# Altium footprint library RPIadaptor.PcbLib: 85 footprints (part 5 of 6)
Each footprint in its own frame and in the unit in brackets; x right, y up, seen from the top. Pads: shape width x height; smd on the part's side, far side on the other; paste and mask are expansions set on the pad; w line width, h text height; cw(c..) or ccw(c..) is an arc to the next point about the centre after c.
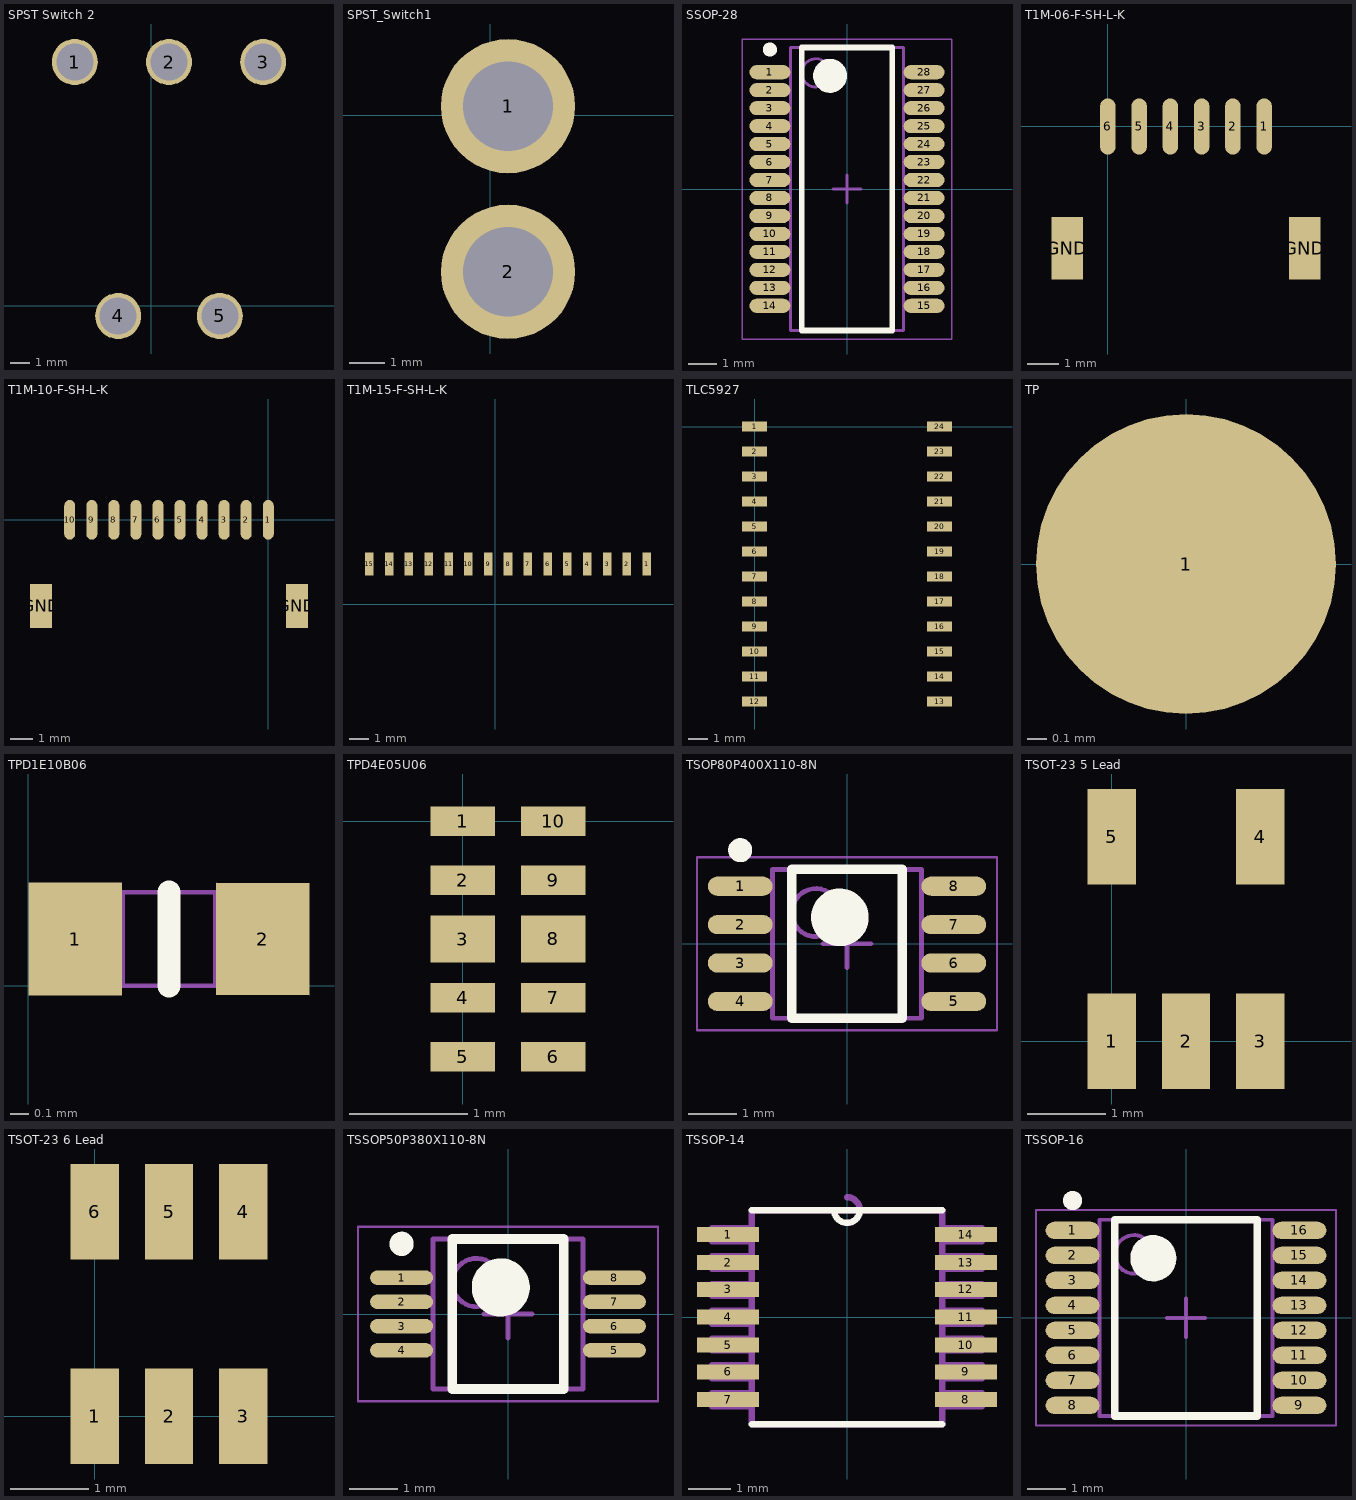
[diagram p4: the footprints below, top view; thin cyan lines are the x and y axes]

## SPST Switch 2 [mm]
pads (5):
  round 2.3 hole 1.85: 1(-3.81,12.192) 2(0.9,12.192) 3(5.61,12.192) 4(-1.64,-0.508) 5(3.44,-0.508)
3D body "M2012S2A2W30.stp": height 3.8, standoff -8.44, extent -5.613,-13.39 7.391,12.954

## SPST_Switch1 [mil]
pads (2):
  round 150 hole 100: 1(20,10) 2(20,-175)
3D body "M2011SS1W01.stp": height 1162.95, standoff -158, extent -217,-427 254.98,85

## SSOP-28 [mm]
height 1.73
pads (28):
  oval 1.45x0.5 smd: 1(-2.725,4.127) 2(-2.725,3.492) 3(-2.725,2.857) 4(-2.725,2.222) 5(-2.725,1.587) 6(-2.725,0.953) 7(-2.725,0.318) 8(-2.725,-0.318) 9(-2.725,-0.953) 10(-2.725,-1.587) 11(-2.725,-2.222) 12(-2.725,-2.857) 13(-2.725,-3.492) 14(-2.725,-4.127) 15(2.725,-4.127) 16(2.725,-3.492) 17(2.725,-2.857) 18(2.725,-2.222) 19(2.725,-1.587) 20(2.725,-0.953) 21(2.725,-0.318) 22(2.725,0.318) 23(2.725,0.953) 24(2.725,1.587) 25(2.725,2.222) 26(2.725,2.857) 27(2.725,3.492) 28(2.725,4.127)
Top Overlay:
  circle w0.25: c-2.725,4.928 r0.125
  circle w0.6: c-0.6,4 r0.3
  lines w0.2: -1.6,-5 -1.6,5 1.6,5 1.6,-5 -1.6,-5
Mechanical 13:
  circle w0.1: c-1.1,4.1 r0.5
  lines w0.1: -2,-5 -2,5 2,5 2,-5 -2,-5
Mechanical 15:
  lines w0.05: -3.7,-5.3 -3.7,5.3 3.7,5.3 3.7,-5.3 -3.7,-5.3
  lines w0.1: -0.5,0 0.5,0 ; 0,-0.5 0,0.5
3D body "SSOP-28b.step": height 1.73, standoff 0, extent -2.997,-5 2.997,5

## T1M-06-F-SH-L-K [mm]
pads (8):
  oval 0.5x1.8 smd: 1(5,0) 2(4,0) 3(3,0) 4(2,0) 5(1,0) 6(0,0)
  rect 1x2 smd: GND(-1.3,-3.9) GND(6.3,-3.9)
3D body "T1M-06-F-SH-L-K.stp": height 4.72, standoff 0, extent -1.7,-5.475 6.7,0.425

## T1M-10-F-SH-L-K [mm]
pads (12):
  oval 0.5x1.8 smd: 1(0,0) 2(-1,0) 3(-2,0) 4(-3,0) 5(-4,0) 6(-5,0) 7(-6,0) 8(-7,0) 9(-8,0) 10(-9,0)
  rect 1x2 smd: GND(-10.3,-3.9) GND(1.3,-3.9)
3D body "T1M-10-F-SH-L-K.stp": height 4.7, standoff -0.02, extent -10.7,-5.475 1.7,0.425

## T1M-15-F-SH-L-K [mil]
pads (15):
  rect 17x45 smd: 1(301.18,80) 2(261.81,80) 3(222.44,80) 4(183.07,80) 5(143.7,80) 6(104.33,80) 7(64.96,80) 8(25.59,80) 9(-13.78,80) 10(-53.15,80) 11(-92.52,80) 12(-131.89,80) 13(-171.26,80) 14(-210.63,80) 15(-250,80)
3D body "T1M-15-F-SH-L.stp": height 181.6, standoff 0.5, extent -317,-137.28 368.04,95

## TLC5927 [mil]
pads (24):
  rect 50x20 smd: 1(0,0) 2(0,-50) 3(0,-100) 4(0,-150) 5(0,-200) 6(0,-250) 7(0,-300) 8(0,-350) 9(0,-400) 10(0,-450) 11(0,-500) 12(0,-550) 13(370,-550) 14(370,-500) 15(370,-450) 16(370,-400) 17(370,-350) 18(370,-300) 19(370,-250) 20(370,-200) 21(370,-150) 22(370,-100) 23(370,-50) 24(370,0)
3D body "User Library-24 pin soic.STEP": height 111.26, standoff 0.63, extent -11.85,-584.18 381.85,30

## TP [mil]
pads (1):
  round 60 all layers, no hole: 1(0,0)

## TPD1E10B06 [mil]
pads (2):
  rect 20x24 smd: 1(10,10) 2(50,10)
Top Overlay:
  lines w5: 30,0 30,20
Mechanical 1:
  lines w1: 10,0 10,20 16.07,20 49.69,20 49.69,0 10.32,0 ; 20.16,0 20.16,20 ; 39.85,0 39.85,20
3D body: height 18, standoff 0, extent 20,0 40,20
3D body: height 18, standoff 0, extent 40,0 49.69,20
3D body: height 18, standoff 0, extent 10,0 20,20

## TPD4E05U06 [mm]
pads (10):
  rect 0.55x0.25 smd: 1(0,0) 2(0,-0.5) 4(0,-1.5) 5(0,-2) 6(0.77,-2) 7(0.77,-1.5) 9(0.77,-0.5) 10(0.77,0)
  rect 0.55x0.4 smd: 3(0,-1) 8(0.77,-1)
3D body "User Library-UDFN10.STEP": height 0.71, standoff 0.16, extent -0.178,-2.241 0.832,0.259

## TSOP80P400X110-8N [mm] "TSOP, 8-Leads, Body 2.50x2.65mm, Pitch 0.80mm, IPC Medium Density"
height 1.1
pads (8):
  oval 1.35x0.4 smd: 1(-2.225,1.2) 2(-2.225,0.4) 3(-2.225,-0.4) 4(-2.225,-1.2) 5(2.225,-1.2) 6(2.225,-0.4) 7(2.225,0.4) 8(2.225,1.2)
Top Overlay:
  circle w0.6: c-0.15,0.55 r0.3
  circle w0.25: c-2.225,1.95 r0.125
  lines w0.2: -1.15,-1.55 1.15,-1.55 1.15,1.55 -1.15,1.55 -1.15,-1.55
Mechanical 13:
  circle w0.1: c-0.65,0.65 r0.5
  lines w0.1: -1.55,-1.55 1.55,-1.55 1.55,1.55 -1.55,1.55 -1.55,-1.55
Mechanical 15:
  lines w0.05: -3.125,-1.8 3.125,-1.8 3.125,1.8 -3.125,1.8 -3.125,-1.8
  lines w0.1: -0.5,0 0.5,0 ; 0,-0.5 0,0.5
3D body "DGK8.stp": height 1.09, standoff 0, extent -2.427,-1.549 2.627,1.549

## TSOT-23 5 Lead [mm]
pads (5):
  rect 0.62x1.22 smd: 1(0,0) 2(0.95,0) 3(1.9,0) 4(1.9,2.62) 5(0,2.62)
3D body "User Library-TSOT23-5.STEP": height 0.95, standoff 0, extent -0.523,-0.284 2.377,2.912

## TSOT-23 6 Lead [mm]
pads (6):
  rect 0.62x1.22 smd: 1(0,0) 2(0.95,0) 3(1.9,0) 4(1.9,2.62) 5(0.95,2.62) 6(0,2.62)
3D body "User Library-TSOT-23.STEP": height 0.86, standoff 0, extent -0.56,-0.135 2.44,2.675

## TSSOP50P380X110-8N [mm] "TSSOP, 8-Leads, Body 2.50x2.65mm, Pitch 0.50mm, IPC Medium Density"
height 1.1
pads (8):
  oval 1.3x0.3 smd: 1(-2.2,0.75) 2(-2.2,0.25) 3(-2.2,-0.25) 4(-2.2,-0.75) 5(2.2,-0.75) 6(2.2,-0.25) 7(2.2,0.25) 8(2.2,0.75)
Top Overlay:
  circle w0.6: c-0.15,0.55 r0.3
  circle w0.25: c-2.2,1.45 r0.125
  lines w0.2: -1.15,-1.55 1.15,-1.55 1.15,1.55 -1.15,1.55 -1.15,-1.55
Mechanical 13:
  circle w0.1: c-0.65,0.65 r0.5
  lines w0.1: -1.55,-1.55 1.55,-1.55 1.55,1.55 -1.55,1.55 -1.55,-1.55
Mechanical 15:
  lines w0.05: -3.1,-1.8 3.1,-1.8 3.1,1.8 -3.1,1.8 -3.1,-1.8
  lines w0.1: -0.5,0 0.5,0 ; 0,-0.5 0,0.5
3D body: height 1.1, standoff 0.1, extent -1.55,-1.55 1.55,1.55
3D body "DGK8.stp": height 1.09, standoff 0, extent -2.527,-1.549 2.527,1.549

## TSSOP-14 [mil]
pads (14):
  rect 58x14 smd: 1(-111,77) 2(-111,51) 3(-111,26) 4(-111,0) 5(-111,-26) 6(-111,-51) 7(-111,-77) 8(111,-77) 9(111,-51) 10(111,-26) 11(111,0) 12(111,26) 13(111,51) 14(111,77)
Top Overlay:
  lines w6: -89,-100 89,-100 ; -89,100 -12,100 ; 89,100 12,100 ; -12,100 ccw(c0,100) 12,100 ; -12,100 12,100
Mechanical 13:
  lines w6: 0,88 ccw(c0,100) 0,112 ; -126,-83 -89,-83 -89,-71 -126,-71 -126,-83 ; -126,-57 -89,-57 -89,-45 -126,-45 -126,-57 ; -126,-31 -89,-31 -89,-20 -126,-20 -126,-31 ; -126,-6 -89,-6 -89,6 -126,6 -126,-6 ; -126,20 -89,20 -89,31 -126,31 -126,20 ; -126,45 -89,45 -89,57 -126,57 -126,45 ; -126,71 -89,71 -89,83 -126,83 -126,71 ; -89,-100 -89,100 -12,100 12,100 89,100 89,-100 -89,-100 ; 89,-83 126,-83 126,-71 89,-71 89,-83 ; 89,-57 126,-57 126,-45 89,-45 89,-57 ; 89,-31 126,-31 126,-20 89,-20 89,-31 ; 89,-6 126,-6 126,6 89,6 89,-6 ; 89,20 126,20 126,31 89,31 89,20 ; 89,45 126,45 126,57 89,57 89,45 ; 89,71 126,71 126,83 89,83 89,71
3D body "User Library-TSSOP-14.STEP": height 47.24, standoff 0, extent -128.98,-98.42 122.99,98.43
3D body: height 59.06, standoff -59.06, extent -38,27 -38,27
3D body: height 59.06, standoff -59.06, extent -7,47 -7,47

## TSSOP-16 [mm]
height 1.2
pads (16):
  oval 1.4x0.45 smd: 1(-2.95,2.275) 2(-2.95,1.625) 3(-2.95,0.975) 4(-2.95,0.325) 5(-2.95,-0.325) 6(-2.95,-0.975) 7(-2.95,-1.625) 8(-2.95,-2.275) 9(2.95,-2.275) 10(2.95,-1.625) 11(2.95,-0.975) 12(2.95,-0.325) 13(2.95,0.325) 14(2.95,0.975) 15(2.95,1.625) 16(2.95,2.275)
Top Overlay:
  circle w0.25: c-2.95,3.05 r0.125
  circle w0.6: c-0.85,1.55 r0.3
  lines w0.2: -1.85,-2.55 -1.85,2.55 1.85,2.55 1.85,-2.55 -1.85,-2.55
Mechanical 13:
  circle w0.1: c-1.35,1.65 r0.5
  lines w0.1: -2.25,-2.55 -2.25,2.55 2.25,2.55 2.25,-2.55 -2.25,-2.55
Mechanical 15:
  lines w0.05: -3.9,-2.8 -3.9,2.8 3.9,2.8 3.9,-2.8 -3.9,-2.8
  lines w0.1: -0.5,0 0.5,0 ; 0,-0.5 0,0.5
3D body "TSSOP-16.step": height 1.2, standoff 0, extent -3.2,-2.55 3.2,2.55